# Altium integrated library 常用元件库.IntLib: 23 symbols
Pins are listed as number, name and electrical type; pins without a type are passive.

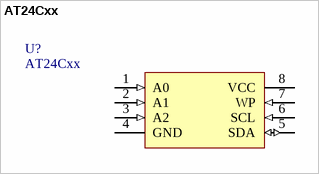
[diagram p0: symbol AT24Cxx]

## AT24Cxx
designator U?
EEPROM
footprint SO-8 (SOIC, 8PIN)
pins: 1 A0 (in), 2 A1 (in), 3 A2 (in), 4 GND (power), 5 SDA (io), 6 SCL (in), 7 WP (in), 8 VCC (power)


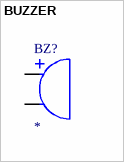
[diagram p1: symbol BUZZER]

## BUZZER
designator BZ?
Buzzer
footprint BUZZER-D12.0X8.5-6.5-0.8 (Buzzer)
pins: 1, 2


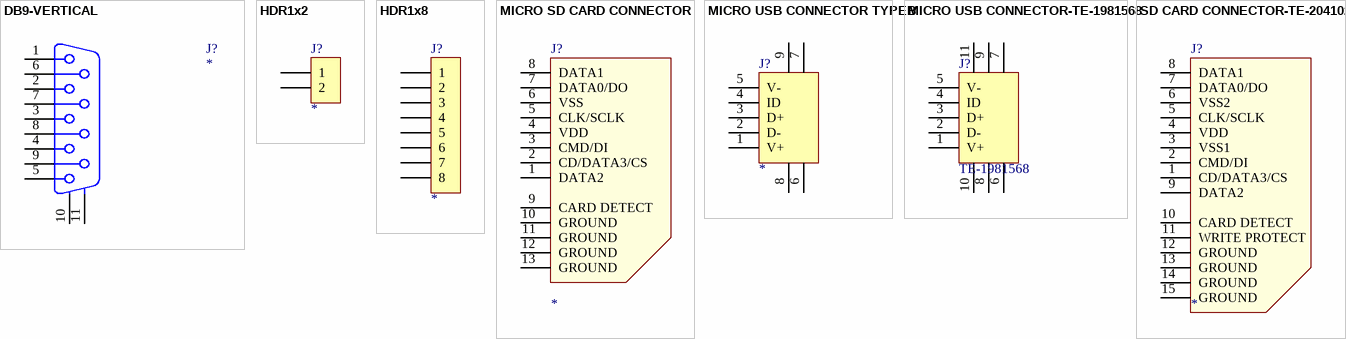
[diagram p2: symbols DB9-VERTICAL to SD CARD CONNECTOR-TE-2041021]

## DB9-VERTICAL
designator J?
Connector
footprint DB9-VERTICAL (D-Subminiature Connector)
pins: 1, 2, 3, 4, 5, 6, 7, 8, 9, 10 MH1, 11 MH2

## HDR1x2
designator J?
Connector
footprint PIN-2-2.54-1.0 (Pin Header)
footprint PIN-2-2.0-0.8 (Pin Header)
footprint PH-2 (Pin Header)
footprint XH-2 (Pin Header)
footprint 5.08-2 (Pin Header)
footprint PH-2-SIDE (Pin Header, Side entry)
footprint PH-2-SIDE-SMD (Pin Header, Side entry, SMD)
footprint XH-2-SIDE (Pin Header, Side entry)
pins: 1, 2

## HDR1x8
designator J?
Connector
footprint PIN-8-2.54-1.0 (Pin Header)
footprint PIN-8-2.0-0.8 (Pin Header)
footprint PH-8 (Pin Header)
footprint XH-8 (Pin Header)
footprint 5.08-8 (Pin Header)
footprint PH-8-SIDE (Pin Header, Side entry)
footprint PH-8-SIDE-SMD (Pin Header, Side entry, SMD)
footprint XH-8-SIDE (Pin Header, Side entry)
footprint MOLEX-53261-0890 (1.25mm Connector, Molex, 53261-0890)
pins: 1, 2, 3, 4, 5, 6, 7, 8

## MICRO SD CARD CONNECTOR
designator J?
Micro SD Card Connector
footprint MICRO SD CARD CONNECTOR (Micro SD Card Connector)
pins: 1 DATA2, 2 CD/DATA3/CS, 3 CMD/DI, 4 VDD (power), 5 CLK/SCLK, 6 VSS (power), 7 DATA0/DO, 8 DATA1, 9 CARD DETECT, 10 GROUND, 11 GROUND, 12 GROUND, 13 GROUND

## MICRO USB CONNECTOR TYPEB
designator J?
USB Connector
footprint MICRO USB CONNECTOR TYPEB-ST-MC-5F-01 (Micro USB Connector, Type B, ST-MC-5F-01)
pins: 1 V+, 2 D-, 3 D+, 4 ID, 5 V-, 6, 7, 8, 9

## MICRO USB CONNECTOR-TE-1981568
designator J?, comment TE-1981568
USB Connector
footprint MICRO USB CONNECTOR-TE-1981568 (Micro USB Connector, TE, 1981568)
pins: 1 V+, 2 D-, 3 D+, 4 ID, 5 V-, 6, 7, 8, 9, 10, 11

## SD CARD CONNECTOR-TE-2041021
designator J?
SD Card Connector
footprint SD CARD CONNECTOR-TE-2041021 (SD Card Connector, TE, 2041021)
pins: 1 CD/DATA3/CS, 2 CMD/DI, 3 VSS1 (power), 4 VDD (power), 5 CLK/SCLK, 6 VSS2 (power), 7 DATA0/DO, 8 DATA1, 9 DATA2, 10 CARD DETECT, 11 WRITE PROTECT, 12 GROUND, 13 GROUND, 14 GROUND, 15 GROUND


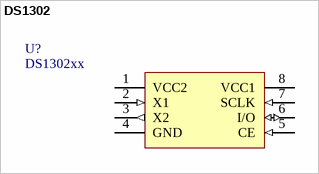
[diagram p3: symbol DS1302]

## DS1302
designator U?, comment DS1302xx
IC
footprint SO-8 (SOIC, 8PIN)
footprint DIP-8 (Dual In-line Package, 8PIN)
pins: 1 VCC2 (power), 2 X1 (in), 3 X2 (out), 4 GND (power), 5 CE (in), 6 I/O (io), 7 SCLK (in), 8 VCC1 (power)


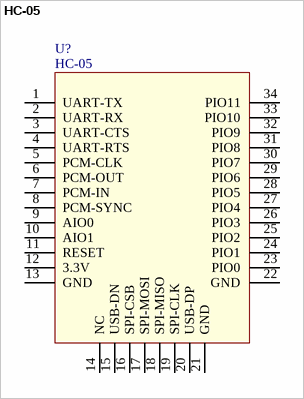
[diagram p4: symbol HC-05]

## HC-05
designator U?
Bluetooth Module
footprint HC-05 (Bluetooth Module, HC-05)
pins: 1 UART-TX, 2 UART-RX, 3 UART-CTS, 4 UART-RTS, 5 PCM-CLK, 6 PCM-OUT, 7 PCM-IN, 8 PCM-SYNC, 9 AIO0, 10 AIO1, 11 RESET, 12 3.3V, 13 GND, 14 NC, 15 USB-DN, 16 SPI-CSB, 17 SPI-MOSI, 18 SPI-MISO, 19 SPI-CLK, 20 USB-DP, 21 GND, 22 GND, 23 PIO0, 24 PIO1, 25 PIO2, 26 PIO3, 27 PIO4, 28 PIO5, 29 PIO6, 30 PIO7, 31 PIO8, 32 PIO9, 33 PIO10, 34 PIO11


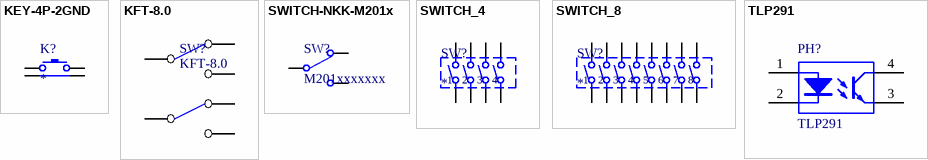
[diagram p5: symbols KEY-4P-2GND to TLP291]

## KEY-4P-2GND
designator K?
Key
footprint TACT-SWITCH-6x3.5-SIDE (TACT-SWITCH)
pins: 1, 2, 3, 4

## KFT-8.0
designator SW?
Switch
footprint KFT-8.0 (PUSH SWITCH)
pins: 1, 2, 3, 4, 5, 6

## SWITCH-NKK-M201x
designator SW?, comment M201xxxxxxx
Switch
footprint TOGGLE SWITCH-M201x (Toggle switch, SPST, NKK)
pins: 1, 2, 3

## SWITCH_4
designator SW?
Switch
footprint MCEMR-04-T (DIP SWITCH)
pins: 1, 2, 3, 4, 5, 6, 7, 8

## SWITCH_8
designator SW?
Switch
footprint MCEMR-08-T (DIP SWITCH)
pins: 1, 2, 3, 4, 5, 6, 7, 8, 9, 10, 11, 12, 13, 14, 15, 16

## TLP291
designator PH?
Optoisolator
footprint SO-4 (SOIC, 4PIN)
pins: 1 A, 2 K, 3 E, 4 C


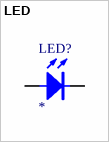
[diagram p6: symbol LED]

## LED
designator LED?
LED
footprint LED-0805 (LED, SMD, 0805)
footprint LED-0603 (LED, SMD, 0603)
footprint LED-1206 (LED, SMD, 1206)
footprint LED-PLCC2-3528 (LED, SMD, PLCC2 3528)
footprint LED-D5 (LED)
pins: 1 A, 2 C


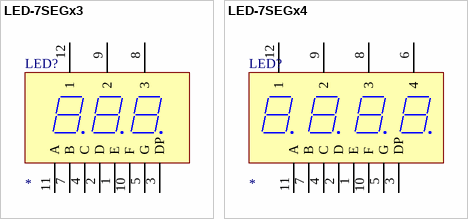
[diagram p7: symbols LED-7SEGx3 to LED-7SEGx4]

## LED-7SEGx3
designator LED?
LED Display
footprint LED-7SEGx3-0.36INCH (LED Digitals Display, 0.36 inch, 3 Digitals)
pins: 1 E, 2 D, 3 DP, 4 C, 5 G, 7 B, 8 3, 9 2, 10 F, 11 A, 12 1

## LED-7SEGx4
designator LED?
LED Display
footprint LED-7SEGx4-0.56INCH (LED Digitals Display, 0.56 inch, 4 Digitals)
pins: 1 E, 2 D, 3 DP, 4 C, 5 G, 6 4, 7 B, 8 3, 9 2, 10 F, 11 A, 12 1


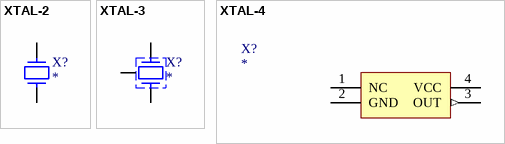
[diagram p8: symbols XTAL-2 to XTAL-4]

## XTAL-2
designator X?
Crystal
footprint HC49-SMD (CRYSTAL, SMD)
footprint HC49S (CRYSTAL)
pins: 1, 2

## XTAL-3
designator X?
Crystal
footprint XTAL-3X8 (Crystal)
pins: 1, 2, 3

## XTAL-4
designator X?
Oscillator
footprint XTAL-5.0X3.2 (Oscillator)
pins: 1 NC, 2 GND (power), 3 OUT (out), 4 VCC (power)